# Altium footprint library Cty1.PcbLib: 870 footprints (part 4 of 55)
Each footprint in its own frame and in the unit in brackets; x right, y up, seen from the top. Pads: shape width x height; smd on the part's side, far side on the other; paste and mask are expansions set on the pad; w line width, h text height; cw(c..) or ccw(c..) is an arc to the next point about the centre after c.
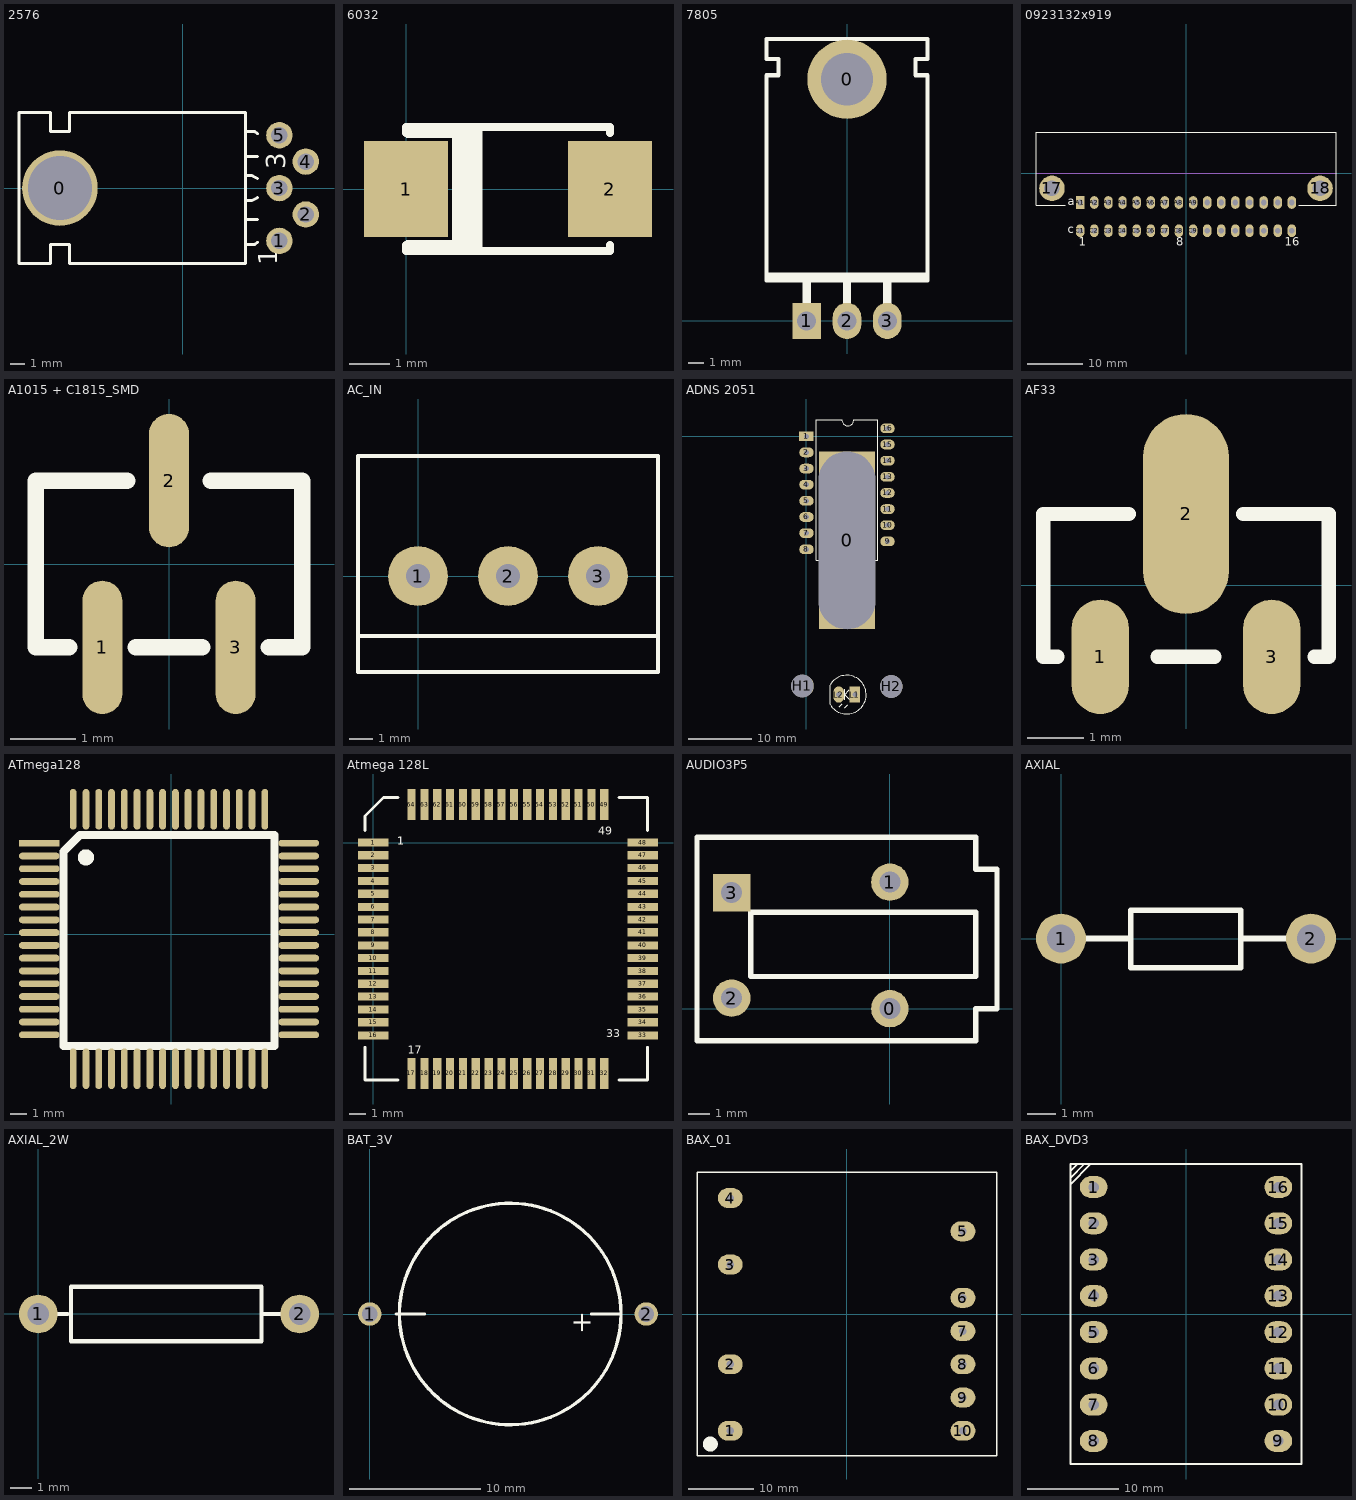
[diagram p3: the footprints below, top view; thin cyan lines are the x and y axes]

## 2576 [mil]
pads (6):
  round 200 hole 170: 0(-325.83,0)
  round 70 hole 43.31: 1(255.83,-140) 2(325.83,-70) 3(255.83,0) 4(325.83,70) 5(255.83,140)
Top Overlay:
  lines w7.87: 165.83,-150 190.83,-150 ; 165.83,-83.33 198.44,-83.33 ; 165.83,-33.33 182.5,-33.33 198.44,-25 ; 165.83,33.33 182.5,33.33 198.44,25 ; 165.83,83.33 198.44,83.33 ; 165.83,150 190.83,150 ; 189.89,150.31 198.44,143.9 ; 192.09,-148.11 198.44,-143.58 ; -434.17,-200 -434.17,200 -350.84,200 -350.84,150 -300.84,150 -300.84,200 165.83,200 165.83,-200 -300.84,-200 -300.84,-150 -350.84,-150 -350.84,-200 -434.17,-200
  text "3" at 270.83,50 h50
  text "1" at 250.83,-205 h50

## 6032 [mm] "SMD"
height 2.5
pads (2):
  rect 2.1x2.4 smd: 1(0,0) 2(5.08,0)
Top Overlay:
  rectangle: 1.143,-1.55 1.905,1.55
  rectangle: 0,1.27 1.27,1.55
  rectangle: 0,-1.55 1.27,-1.27
  lines w0.2: 0,-1.397 0,-1.55 5.08,-1.55 5.08,-1.397 ; 0,1.397 0,1.55 5.08,1.55 5.08,1.397

## 7805 [mm] "TO, Thru-Hole, Vertical, Heatsink Mounted; 3 In-Line Leads; Pitch 2.54 mm; Pin sequence 1, 3, 2"
height 16.4
pads (4):
  round 5 hole 3.3: 0(0,15.24)
  rect 1.8x2.286 hole 1.2: 1(-2.54,0)
  oval 1.8x2.286 hole 1.2: 2(0,0) 3(2.54,0)
Top Overlay:
  circle w0.203: c0,15.24 r1.27
  rectangle: -0.254,0.762 0.254,2.54
  region: 2.794,2.54 2.286,2.54 2.286,0.762 2.794,0.762
  rectangle: -2.794,0.762 -2.286,2.54
  rectangle: -5.08,2.54 5.08,3.048
  lines w0.254: -5.08,2.54 -5.08,15.494 -4.318,15.494 -4.318,16.51 -5.08,16.51 -5.08,17.78 5.08,17.78 5.08,16.51 4.318,16.51 4.318,15.494 5.08,15.494 5.08,2.54 -5.08,2.54

## 0923132x919 [mm] "Connector; DIN 41612, Type 2C, Thru-Hole; Rows a+c, 32 Position; Right Angle"
height 11.1
pads (34):
  round 4.6 hole 2.8: 17(-24.13,-2.76) 18(24.13,-2.76)
  rect 1.524x2.286 hole 1: A1(-19.05,-5.3)
  oval 1.524x2.286 hole 1: A2(-16.51,-5.3) A3(-13.97,-5.3) A4(-11.43,-5.3) A5(-8.89,-5.3) A6(-6.35,-5.3) A7(-3.81,-5.3) A8(-1.27,-5.3) A9(1.27,-5.3) A10(3.81,-5.3) A11(6.35,-5.3) A12(8.89,-5.3) A13(11.43,-5.3) A14(13.97,-5.3) A15(16.51,-5.3) A16(19.05,-5.3) C1(-19.05,-10.38) C2(-16.51,-10.38) C3(-13.97,-10.38) C4(-11.43,-10.38) C5(-8.89,-10.38) C6(-6.35,-10.38) C7(-3.81,-10.38) C8(-1.27,-10.38) C9(1.27,-10.38) C10(3.81,-10.38) C11(6.35,-10.38) C12(8.89,-10.38) C13(11.43,-10.38) C14(13.97,-10.38) C15(16.51,-10.38) C16(19.05,-10.38)
Top Overlay:
  lines w0.2: -21.75,-5.8 -27,-5.8 -27,7.34 27,7.34 27,-5.8 20.275,-5.8
  text "16" at 17.8,-13.08 h1.5
  text "8" at -1.77,-13.08 h1.5
  text "c" at -21.26,-10.88 h1.5
  text "a" at -21.26,-5.8 h1.5
  text "1" at -19.3,-13.08 h1.5
Mechanical 1:
  lines w0.1: -27,0 27,0
  text "PCB Edge" at -26.15,0.5 h0.6

## A1015 + C1815_SMD [mil]
pads (3):
  oval 24x80 smd: 1(-40,-50) 2(0,50) 3(40,-50)
Top Overlay:
  lines w10: -60,-50 -80,-50 -80,50 -60,50 -25,50 ; -20,-50 20,-50 ; 25,50 80,50 80,-50 60,-50

## AC_IN [mil] "AC_Input"
height 3
pads (3):
  round 100 hole 40 square: 1(0,0) 2(150,0) 3(300,0)
Top Overlay:
  lines w7: -100,-100 400,-100 ; -100,-160 -100,200 400,200 400,-160 -100,-160

## ADNS 2051 [mil] "Foots pin for Mouse"
pads (21):
  rect 350x1100 hole 350 slot 1100 at 90 deg: 0(251,-645)
  rect 90x60 hole 31: 1(0,0)
  oval 90x60 hole 31: 2(0,-100) 3(0,-200) 4(0,-300) 5(0,-400) 6(0,-500) 7(0,-600) 8(0,-700) 9(502,-651) 10(502,-551) 11(502,-451) 12(502,-351) 13(502,-251) 14(502,-151) 15(502,-51) 16(502,49)
  round 140 hole 140: H1(-25,-1547) H2(525,-1550)
  rect 65x100 hole 32: L1(300,-1600.5)
  oval 65x100 hole 32: L2(200,-1600.5)
Top Overlay:
  lines w7: 146,-1660.5 146,-1541.5 ; 146.06,-1540.53 cw(c250,-1600.5) 146.49,-1661.21 ; 204,-1675.5 221,-1658.5 ; 218,103 59,103 59,-767 443,-767 443,103 296,103 ; 218.97,101 ccw(c255.99,101) 293,101 ; 236,-1632.5 236,-1566.5 ; 238,-1681.5 255,-1664.5 ; 265,-1629.5 236,-1600.5 265,-1571.5 ; 394.94,-516.95 ccw(c252.8,-525.96) 395,-518
  text "ADNS2051" at 108,-229 h40

## AF33 [mil]
pads (3):
  oval 40x80 smd: 1(-60,-50) 3(60,-50)
  oval 60x140 smd: 2(0,50)
Top Overlay:
  lines w10: -90,-50 -100,-50 -100,50 -60,50 -40,50 ; -20,-50 20,-50 ; 40,50 100,50 100,-50 90,-50

## ATmega128 [mm] "Atmega128"
pads (64):
  rect 2.54x0.432 smd: 1(-8.255,5.715)
  oval 2.54x0.432 smd: 2(-8.255,4.915) 3(-8.255,4.115) 4(-8.255,3.315) 5(-8.255,2.515) 6(-8.255,1.715) 7(-8.255,0.915) 8(-8.255,0.115) 9(-8.255,-0.685) 10(-8.255,-1.485) 11(-8.255,-2.285) 12(-8.255,-3.085) 13(-8.255,-3.885) 14(-8.255,-4.685) 15(-8.255,-5.485) 16(-8.255,-6.285) 33(7.995,-6.285) 34(7.995,-5.485) 35(7.995,-4.685) 36(7.995,-3.885) 37(7.995,-3.085) 38(7.995,-2.285) 39(7.995,-1.485) 40(7.995,-0.685) 41(7.995,0.115) 42(7.995,0.915) 43(7.995,1.715) 44(7.995,2.515) 45(7.995,3.315) 46(7.995,4.115) 47(7.995,4.915) 48(7.995,5.715)
  oval 0.432x2.54 smd: 17(-6.13,-8.41) 18(-5.33,-8.41) 19(-4.53,-8.41) 20(-3.73,-8.41) 21(-2.93,-8.41) 22(-2.13,-8.41) 23(-1.33,-8.41) 24(-0.53,-8.41) 25(0.27,-8.41) 26(1.07,-8.41) 27(1.87,-8.41) 28(2.67,-8.41) 29(3.47,-8.41) 30(4.27,-8.41) 31(5.07,-8.41) 32(5.87,-8.41) 49(5.87,7.84) 50(5.07,7.84) 51(4.27,7.84) 52(3.47,7.84) 53(2.67,7.84) 54(1.87,7.84) 55(1.07,7.84) 56(0.27,7.84) 57(-0.53,7.84) 58(-1.33,7.84) 59(-2.13,7.84) 60(-2.93,7.84) 61(-3.73,7.84) 62(-4.53,7.84) 63(-5.33,7.84) 64(-6.13,7.84)
Top Overlay:
  circle w0.508: c-5.334,4.826 r0.254
  lines w0.508: -6.731,-6.985 6.477,-6.985 6.477,6.223 -5.715,6.223 -6.731,5.207 -6.731,-6.985

## Atmega 128L [mil] "Atmega 128L, 64 pin SMT"
height 100
pads (64):
  rect 75x20 smd: 1(0,0) 2(0,-31) 3(0,-62) 4(0,-94) 5(0,-125) 6(0,-157) 7(0,-188) 8(0,-219) 9(0,-251) 10(0,-282) 11(0,-314) 12(0,-345) 13(0,-376) 14(0,-408) 15(0,-439) 16(0,-471) 33(658,-471) 34(658,-439) 35(658,-408) 36(658,-376) 37(658,-345) 38(658,-314) 39(658,-282) 40(658,-251) 41(658,-219) 42(658,-188) 43(658,-157) 44(658,-125) 45(658,-94) 46(658,-62) 47(658,-31) 48(658,0)
  rect 20x75 smd: 17(93,-564) 18(125,-564) 19(156,-564) 20(187,-564) 21(219,-564) 22(250,-564) 23(282,-564) 24(313,-564) 25(344,-564) 26(376,-564) 27(407,-564) 28(439,-564) 29(470,-564) 30(501,-564) 31(533,-564) 32(564,-564) 49(564,93) 50(533,93) 51(501,93) 52(470,93) 53(439,93) 54(407,93) 55(376,93) 56(344,93) 57(313,93) 58(282,93) 59(250,93) 60(219,93) 61(187,93) 62(156,93) 63(125,93) 64(93,93)
Top Overlay:
  lines w7: -20,-500 -20,-580 60,-580 ; -20,30 -20,65 25,110 60,110 ; 600,-580 670,-580 670,-500 ; 600,110 670,110 670,30
  text "1" at 59,-5.5 h20
  text "1" at 59,-5.5 h20
  text "49" at 549,19.5 h20
  text "17" at 84,-515.5 h20
  text "33" at 569,-475.5 h20

## AUDIO3P5 [mm]
pads (4):
  round 1.778 hole 1 unplated: 0(0,0) 1(0,6) 2(-7.5,0.5)
  rect 1.778x1.778 hole 1 unplated: 3(-7.5,5.5)
Top Overlay:
  lines w0.254: -9.144,-1.524 -9.144,8.128 1.524,8.128 4.064,8.128 4.064,6.604 5.08,6.604 5.08,0 4.064,0 4.064,-1.524 -9.144,-1.524 ; -6.604,1.524 -6.604,4.572 4.064,4.572 4.064,1.524 -6.604,1.524

## AXIAL [mil]
pads (2):
  round 70 hole 39.37 unplated: 1(0,0) 2(350,0)
Top Overlay:
  lines w7.87: 35,0 93,0 ; 97.57,-40.63 251.57,-40.63 ; 97.57,-39.37 97.57,39.37 251.57,39.37 251.57,0 ; 251.57,-40 251.57,-0.63 ; 255,0 313,0

## AXIAL_2W [mil]
pads (2):
  round 70 hole 39.37 unplated: 1(0,0) 2(472.44,0)
Top Overlay:
  lines w7.87: 14,0 52.57,0 ; 413.39,0 452.76,0 ; 435.88,0 403.54,0 ; 403.54,0 403.54,-49.21 59.06,-49.21 59.06,49.21 403.54,49.21 403.54,0

## BAT_3V [mil]
pads (2):
  round 70 hole 47.24 unplated: 1(0,0) 2(826.77,0)
Top Overlay:
  circle w10: c420,0 r331.06
  lines w7.87: 78.74,0 164.37,0 ; 662.4,0 748.03,0
  text "+" at 660,-60 h60

## BAX_01 [mil] "Bien ap xung cho nguon T9AT"
pads (10):
  oval 150x120 hole 45: 1(-700,-700) 2(-700,-300) 3(-700,300) 4(-700,700) 5(700,500) 6(700,100) 7(700,-100) 8(700,-300) 9(700,-500) 10(700,-700)
Top Overlay:
  circle w50: c-820,-780 r20
  lines w8: -900,-850 905,-850 905,855 -900,855 -900,-850

## BAX_DVD3 [mil] "Bien ap xung DVD3"
pads (16):
  oval 120x95 hole 45: 1(-400,550) 2(-400,392.86) 3(-400,235.71) 4(-400,78.57) 5(-400,-78.57) 6(-400,-235.71) 7(-400,-392.86) 8(-400,-550) 9(400,-550) 10(400,-392.86) 11(400,-235.71) 12(400,-78.57) 13(400,78.57) 14(400,235.71) 15(400,392.86) 16(400,550)
Top Overlay:
  lines w8: -500,563 -414,649 ; -500,589 -500,591 -442,649 ; -500,618 -500,620 -471,649 ; -500,-650 -500,650 490,650 500,650 500,-650 -500,-650